# Altium footprint library HW_HOLLAND_NCDM_MONITOR_R1.PcbLib: 472 footprints (part 21 of 30)
Each footprint in its own frame and in the unit in brackets; x right, y up, seen from the top. Pads: shape width x height; smd on the part's side, far side on the other; paste and mask are expansions set on the pad; w line width, h text height; cw(c..) or ccw(c..) is an arc to the next point about the centre after c.
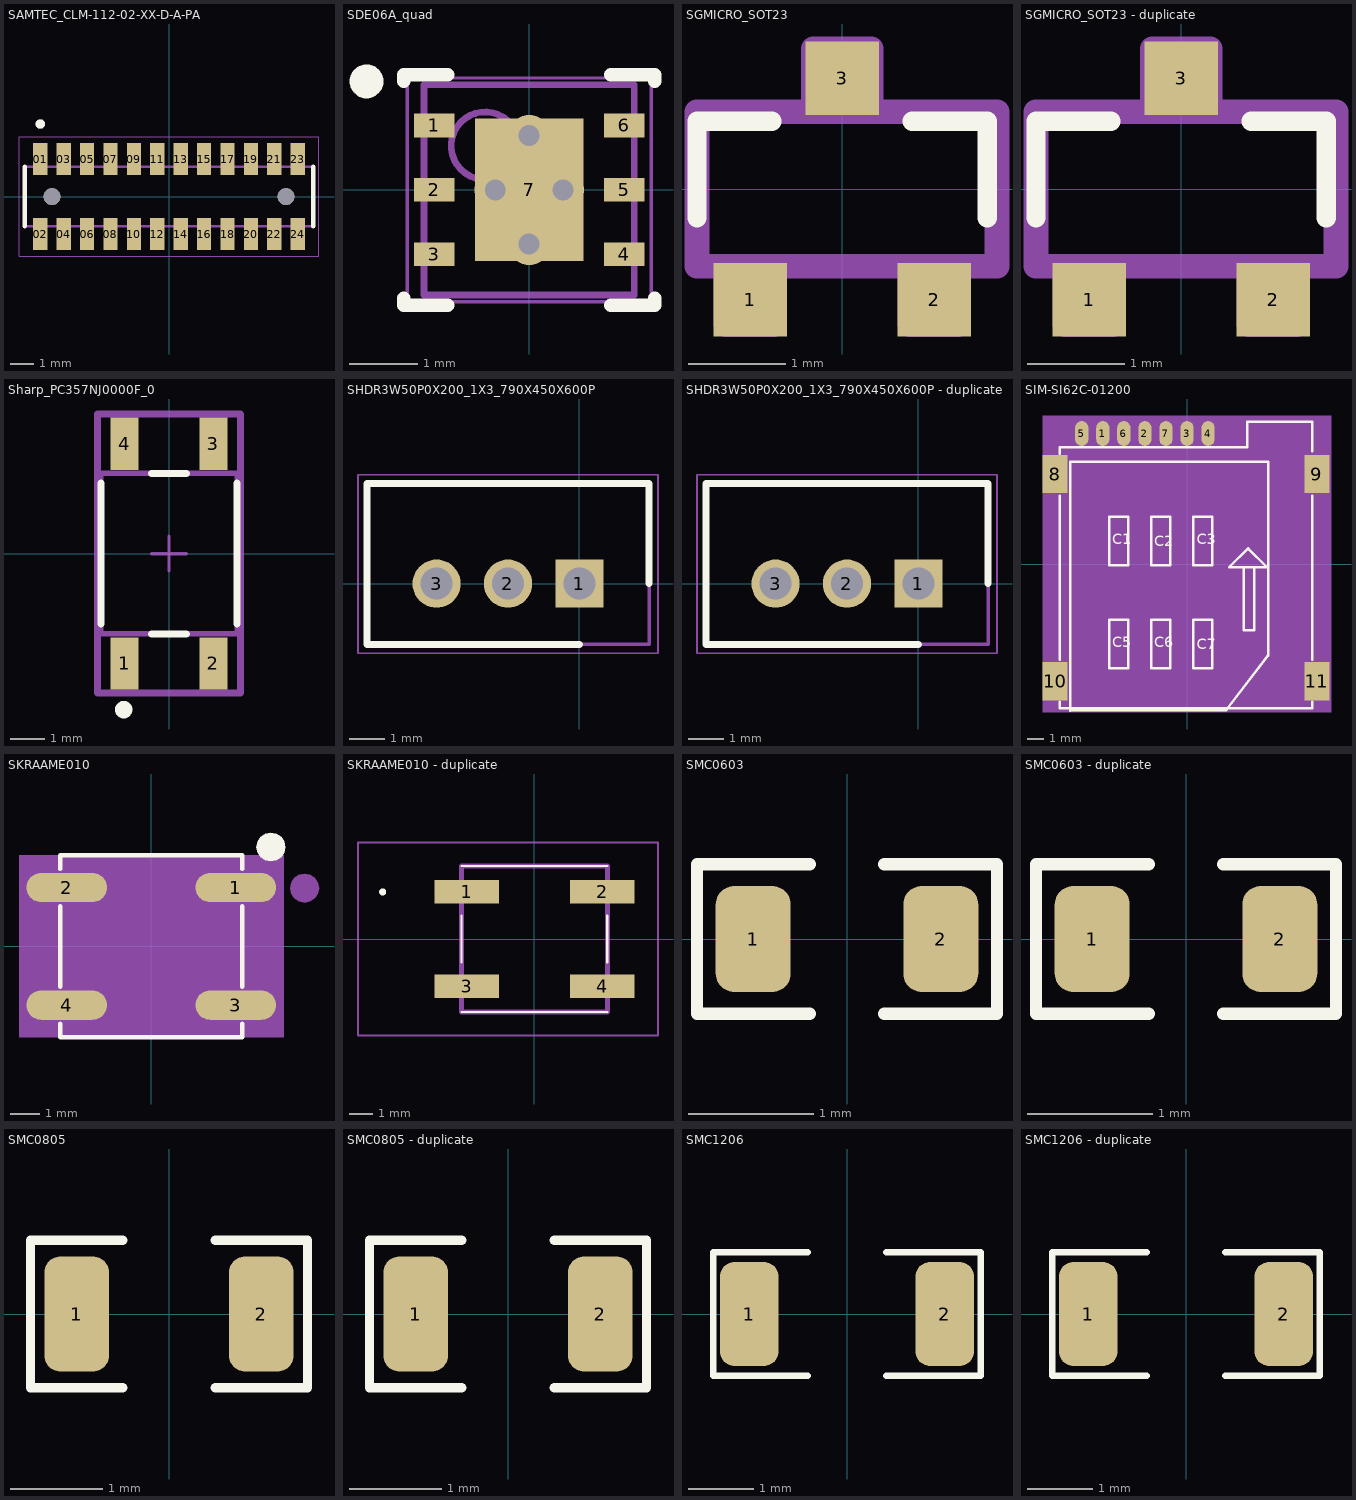
[diagram p20: the footprints below, top view; thin cyan lines are the x and y axes]

## SAMTEC_CLM-112-02-XX-D-A-PA [mm]
pads (26):
  rect 0.61x1.37 smd: 01(-5.5,1.601) 02(-5.5,-1.601) 03(-4.5,1.601) 04(-4.5,-1.601) 05(-3.5,1.601) 06(-3.5,-1.601) 07(-2.5,1.601) 08(-2.5,-1.601) 09(-1.5,1.601) 10(-1.5,-1.601) 11(-0.5,1.601) 12(-0.5,-1.601) 13(0.5,1.601) 14(0.5,-1.601) 15(1.5,1.601) 16(1.5,-1.601) 17(2.5,1.601) 18(2.5,-1.601) 19(3.5,1.601) 20(3.5,-1.601) 21(4.5,1.601) 22(4.5,-1.601) 23(5.5,1.601) 24(5.5,-1.601)
  round 0.715 hole 0.715 unplated: ""(-5,0) ""(5,0)
Top Overlay:
  circle w0.2: c-5.5,3.1 r0.1
  lines w0.2: -6.159,-1.27 -6.159,1.27 ; 6.159,-1.27 6.159,1.27
Mechanical 13:
  circle w0.2: c-5.5,3.1 r0.1
  lines w0.1: -6.159,-1.27 -6.159,1.27 6.159,1.27 6.159,-1.27 -6.159,-1.27
Mechanical 15:
  lines w0.05: -6.409,-2.55 -2.04,-2.55 2.04,-2.55 6.409,-2.55 6.409,2.55 2.04,2.55 -2.04,2.55 -6.409,2.55 -6.409,-2.55
3D body "CLM-112-02-G-D-A-TR.stp": height 2.27, standoff -0.48, extent -6.159,-1.905 6.159,1.905

## SDE06A_quad [mm]
pads (7):
  rect 0.6x0.35 smd paste-0.175 mask+0.051: 1(-1.4,0.95) 2(-1.4,0) 3(-1.4,-0.95) 4(1.4,-0.95) 5(1.4,0) 6(1.4,0.95)
  rect 1.6x2.1 smd paste-0.8 mask+0.051: 7(0,0)
via -0.5,0 diameter 0.61 hole 0.308
via 0,0.8 diameter 0.61 hole 0.308
via 0.5,0 diameter 0.61 hole 0.308
via 0,-0.8 diameter 0.61 hole 0.308
Top Overlay:
  circle w0.25: c-2.4,1.6 r0.125
  lines w0.2: -1.85,-1.6 -1.85,-1.7 -1.2,-1.7 ; -1.85,1.6 -1.85,1.7 -1.2,1.7 ; 1.2,-1.7 1.85,-1.7 1.85,-1.6 ; 1.2,1.7 1.85,1.7 1.85,1.6
Top Paste:
  rectangle: -1.9,0.775 -1.2,1.125
  rectangle: -1.9,-0.175 -1.2,0.175
  rectangle: -1.9,-1.125 -1.2,-0.775
  region: 1.9,-0.775 1.2,-0.775 1.2,-1.125 1.9,-1.125
  region: 1.9,0.175 1.2,0.175 1.2,-0.175 1.9,-0.175
  region: 1.9,1.125 1.2,1.125 1.2,0.775 1.9,0.775
  rectangle: 0.1,0.1 0.7,0.95
  region: -0.1,0.95 -0.7,0.95 -0.7,0.1 -0.1,0.1
  region: -0.1,-0.1 -0.7,-0.1 -0.7,-0.95 -0.1,-0.95
  rectangle: 0.1,-0.95 0.7,-0.1
Mechanical 13:
  circle w0.1: c-0.65,0.65 r0.5
  lines w0.1: -1.55,-1.55 -1.55,1.55 1.55,1.55 1.55,-1.55 -1.55,-1.55
Mechanical 15:
  lines w0.05: -1.8,-1.65 1.8,-1.65 1.8,1.65 -1.8,1.65 -1.8,-1.65
  lines w0.1: -0.5,0 0.5,0 ; 0,-0.5 0,0.5
3D body: height 0.8, standoff 0, extent -1.55,-1.55 1.55,1.55

## SGMICRO_SOT23 [mm]
pads (3):
  rect 0.76x0.76 smd: 1(-0.95,-1.145) 2(0.95,-1.145) 3(0,1.145)
Top Overlay:
  lines w0.2: -1.5,-0.3 -1.5,0.7 -0.725,0.7 ; 0.725,0.7 1.5,0.7 1.5,-0.3
Top Designator:
  lines w0.254: -1.2,-0.8 -1.2,-1.4 -0.7,-1.4 -0.7,-0.8 ; -0.3,0.8 -0.3,1.45 0.3,1.45 0.3,0.8 ; 0.7,-0.8 0.7,-1.4 1.2,-1.4 1.2,-0.8 ; -1.5,-0.8 -1.5,0.8 1.6,0.8 1.6,-0.8 -1.5,-0.8
  text ".Designator" at -3.809,-0.254 h0.76
3D body "SOT23_FMMT493TA.step": height 1.1, standoff 0, extent -1.5,-1.25 1.5,1.25

## SGMICRO_SOT23 - duplicate [mm]
pads (3):
  rect 0.76x0.76 smd: 1(-0.95,-1.145) 2(0.95,-1.145) 3(0,1.145)
Top Overlay:
  lines w0.2: -1.5,-0.3 -1.5,0.7 -0.725,0.7 ; 0.725,0.7 1.5,0.7 1.5,-0.3
Top Designator:
  lines w0.254: -1.2,-0.8 -1.2,-1.4 -0.7,-1.4 -0.7,-0.8 ; -0.3,0.8 -0.3,1.45 0.3,1.45 0.3,0.8 ; 0.7,-0.8 0.7,-1.4 1.2,-1.4 1.2,-0.8 ; -1.5,-0.8 1.6,-0.8 1.6,0.8 -1.5,0.8 -1.5,-0.8
  text ".Designator" at -3.809,-0.254 h0.76
3D body "SOT23_FMMT493TA.step": height 1.1, standoff 0, extent -1.5,-1.25 1.5,1.25

## Sharp_PC357NJ0000F_0 [mm]
pads (4):
  rect 0.8x1.5 smd paste+0 mask+0: 1(-1.27,-3.15) 2(1.27,-3.15) 3(1.27,3.15) 4(-1.27,3.15)
Top Overlay:
  circle w0.25: c-1.3,-4.475 r0.125
  lines w0.2: -1.95,-2.025 -1.95,2.025 ; -0.495,-2.3 0.495,-2.3 ; -0.495,2.3 0.495,2.3 ; 1.95,-2.025 1.95,2.025
Top Courtyard:
  lines w0.2: -2.05,-4 -2.05,4 2.05,4 2.05,-4 -2.05,-4
  text ".Designator" at 0,0 h1.25
Mechanical 12:
  lines w0.15: -1.95,-2.3 -1.95,2.3 1.95,2.3 1.95,-2.3 -1.95,-2.3
Mechanical 15:
  lines w0.1: -0.5,0 0.5,0 ; 0,-0.5 0,0.5
  lines w0.2: -2.05,-4 -2.05,4 2.05,4 2.05,-4 -2.05,-4
3D body "IC_Sharp_PC357NJ0000F_eec.STEP": height 0.25, standoff 0, extent -2.05,-4 2.05,4

## SHDR3W50P0X200_1X3_790X450X600P [mm]
pads (3):
  rect 1.35x1.35 hole 0.9: 1(0,0)
  round 1.35 hole 0.9: 2(-2,0) 3(-4,0)
Top Overlay:
  lines w0.2: 0,-1.7 -5.95,-1.7 -5.95,2.8 1.95,2.8 1.95,0
Mechanical 13:
  lines w0.1: -5.95,-1.7 1.95,-1.7 1.95,2.8 -5.95,2.8 -5.95,-1.7
Mechanical 15:
  lines w0.05: -6.2,-1.95 2.2,-1.95 2.2,3.05 -6.2,3.05 -6.2,-1.95
3D body "JST - PH - Thru (V) - 3Pin - 2.00mm.stp": height 5.89, standoff -3.05, extent -5.861,-1.737 2,2.937

## SHDR3W50P0X200_1X3_790X450X600P - duplicate [mm]
pads (3):
  rect 1.35x1.35 hole 0.9: 1(0,0)
  round 1.35 hole 0.9: 2(-2,0) 3(-4,0)
Top Overlay:
  lines w0.2: 0,-1.7 -5.95,-1.7 -5.95,2.8 1.95,2.8 1.95,0
Mechanical 13:
  lines w0.1: -5.95,-1.7 1.95,-1.7 1.95,2.8 -5.95,2.8 -5.95,-1.7
Mechanical 15:
  lines w0.05: -6.2,-1.95 2.2,-1.95 2.2,3.05 -6.2,3.05 -6.2,-1.95
3D body "JST - PH - Thru (V) - 3Pin - 2.00mm.stp": height 5.89, standoff -3.05, extent -5.861,-1.737 2,2.937

## SIM-SI62C-01200 [mil]
pads (11):
  oval 31.5x59.06 smd: 1(-200.06,309.9) 2(-100.06,309.9) 3(-0.06,309.9) 4(49.94,309.9) 5(-250.06,309.9) 6(-150.06,309.9) 7(-50.06,309.9)
  rect 59.06x90.55 smd: 8(-313.52,213.56) 9(308.52,213.56) 10(-313.52,-278.56) 11(308.52,-278.56)
Top Overlay:
  lines w6: -302.5,-327.5 -302.5,-342.5 297.5,-342.5 297.5,-327.5 ; -302.5,-227.5 -302.5,162.5 ; -302.5,262.5 -302.5,277.5 142.5,277.5 142.5,337.5 297.5,337.5 297.5,267.5 ; 297.5,-227.5 297.5,162.5 ; -277.5,-348.05 92.5,-347.5 192.5,-217.5 192.5,242.5 -277.5,242.5 -277.5,-348.05 ; -184.98,-247.78 -184.98,-132.78 -139.98,-132.78 -139.98,-247.78 -184.98,-247.78 ; -184.98,-2.78 -184.98,112.22 -139.98,112.22 -139.98,-2.78 -184.98,-2.78 ; -84.98,-247.78 -84.98,-132.78 -39.98,-132.78 -39.98,-247.78 -84.98,-247.78 ; -84.98,-2.78 -84.98,112.22 -39.98,112.22 -39.98,-2.78 -84.98,-2.78 ; 15.02,-247.78 15.02,-132.78 60.02,-132.78 60.02,-247.78 15.02,-247.78 ; 15.02,-2.78 15.02,112.22 60.02,112.22 60.02,-2.78 15.02,-2.78 ; 100.02,-7.78 145.02,37.22 190.02,-7.78 100.02,-7.78 ; 135.02,-157.78 135.02,-7.78 160.02,-7.78 160.02,-157.78 135.02,-157.78
  text "C1" at -177.5,47.5 h25
  text "C2" at -77.5,42.5 h25
  text "C3" at 22.5,47.5 h25
  text "C5" at -177.5,-197.5 h25
  text "C6" at -77.5,-197.5 h25
  text "C7" at 22.5,-202.5 h25
Top Assembly:
  lines w1: -303.68,-341.56 298.68,-341.56 298.68,335.61 141.2,335.61 141.2,276.56 -303.68,276.56 -303.68,-341.56
Top 3D Body:
  region: -342.5,352.5 342.5,352.5 342.5,-352.5 -342.5,-352.5
Mechanical 17:
  text "6" at -157.26,309.9 h18
  text "1" at -207.26,309.9 h18
  text "7" at -57.26,309.9 h18
  text "4" at 42.74,309.9 h18
  text "2" at -107.26,309.9 h18
  text "3" at -7.26,309.9 h18
  text "10" at -327.92,-278.56 h18
  text "11" at 294.12,-278.56 h18
  text "8" at -320.72,213.56 h18
  text "5" at -257.26,309.9 h18
  text "9" at 301.32,213.56 h18
3D body: height 150, standoff 0, extent -342.5,-352.5 342.5,352.5

## SKRAAME010 [mm]
pads (4):
  oval 2.75x1 smd: 1(2.875,2) 2(-2.875,2) 3(2.875,-2) 4(-2.875,-2)
Top Overlay:
  dashed: 4.564,3.379 4.527,3.567 4.42,3.727 4.26,3.834 4.071,3.872 3.882,3.834 3.829,3.798 3.722,3.727 3.615,3.567 3.578,3.379 3.615,3.19 3.722,3.03 3.829,2.959 3.882,2.923 4.071,2.885 4.26,2.923 4.42,3.03 4.527,3.19
  lines w0.152: -3.1,-2.63 -3.1,-3.1 3.1,-3.1 3.1,-2.63 ; -3.1,-1.37 -3.1,1.37 ; -3.1,2.63 -3.1,3.1 3.1,3.1 3.1,2.63 ; 3.1,-1.37 3.1,1.37
  text ".Designator" at -0.635,-0.212 h0.64
Top Assembly:
  dashed: 5.707,1.982 5.67,2.17 5.563,2.33 5.403,2.437 5.214,2.475 5.025,2.437 4.972,2.401 4.865,2.33 4.758,2.17 4.721,1.982 4.758,1.793 4.865,1.633 4.972,1.562 5.025,1.526 5.214,1.488 5.403,1.526 5.563,1.633 5.67,1.793
  lines w0.025: -3.1,-3.1 -3.1,3.1 3.1,3.1 3.1,-3.1 -3.1,-3.1
Top 3D Body:
  region: -4.5,3.1 -4.5,-3.1 4.5,-3.1 4.5,3.1
Mechanical 17:
  text "4" at -3.066,-2.37 h0.46
  text "3" at 2.664,-2.37 h0.46
  text "2" at -3.036,1.67 h0.46
  text "1" at 2.764,1.73 h0.46
3D body: height 3.81, standoff 0, extent -4.5,-3.1 4.5,3.1

## SKRAAME010 - duplicate [mm]
pads (4):
  rect 2.75x1 smd: 1(-2.875,2) 2(2.875,2) 3(-2.875,-2) 4(2.875,-2)
Top Overlay:
  lines w0.1: -3.1,-3.1 3.1,-3.1 -3.1,-3.1 ; -3.1,-1 -3.1,1 -3.1,-1 ; -3.1,3.1 3.1,3.1 -3.1,3.1 ; 3.1,-1 3.1,1 3.1,-1
  lines w0.2: -6.5,2 ccw(c-6.45,2) -6.4,2 ; -6.5,2 cw(c-6.45,2) -6.4,2 ; -6.5,2 ccw(c-6.45,2) -6.4,2
Mechanical 13:
  lines w0.2: -3.1,-3.1 -3.1,3.1 3.1,3.1 3.1,-3.1 -3.1,-3.1
Mechanical 15:
  lines w0.1: -7.5,-4.1 -7.5,4.1 5.25,4.1 5.25,-4.1 -7.5,-4.1
3D body "SKRAAME010.stp": height 5.1, standoff -0.08, extent -3.399,-3.215 3.399,3.215

## SMC0603 [mm]
pads (2):
  rrect50% 0.6x0.85 smd: 1(-0.75,0) 2(0.75,0)
Top Overlay:
  lines w0.1: -0.3,-0.6 -1.2,-0.6 -1.2,0.6 -0.3,0.6 ; 0.3,-0.6 1.2,-0.6 1.2,0.6 0.3,0.6
3D body "Cap 0603(1608)x80N.STEP": height 0.81, standoff 0, extent -0.8,-0.4 0.8,0.4

## SMC0603 - duplicate [mm]
pads (2):
  rrect50% 0.6x0.85 smd: 1(-0.75,0) 2(0.75,0)
Top Overlay:
  lines w0.1: -0.3,-0.6 -1.2,-0.6 -1.2,0.6 -0.3,0.6 ; 0.3,-0.6 1.2,-0.6 1.2,0.6 0.3,0.6
3D body "Cap 0603(1608)x80N.STEP": height 0.81, standoff 0, extent -0.8,-0.4 0.8,0.4

## SMC0805 [mm]
pads (2):
  rrect50% 0.7x1.25 smd: 1(-1,0) 2(1,0)
Top Overlay:
  lines w0.1: -0.5,-0.8 -1.5,-0.8 -1.5,0.8 -0.5,0.8 ; 0.5,-0.8 1.5,-0.8 1.5,0.8 0.5,0.8
3D body "Cap 0805(2012)x85N.STEP": height 0.86, standoff 0, extent -1,-0.625 1,0.625

## SMC0805 - duplicate [mm]
pads (2):
  rrect50% 0.7x1.25 smd: 1(-1,0) 2(1,0)
Top Overlay:
  lines w0.1: -0.5,-0.8 -1.5,-0.8 -1.5,0.8 -0.5,0.8 ; 0.5,-0.8 1.5,-0.8 1.5,0.8 0.5,0.8
3D body "Cap 0805(2012)x85N.STEP": height 0.86, standoff 0, extent -1,-0.625 1,0.625

## SMC1206 [mm]
pads (2):
  rrect50% 0.9x1.6 smd mask+0.102: 1(-1.5,0) 2(1.5,0)
Top Overlay:
  lines w0.1: -0.6,-0.95 -2.05,-0.95 -2.05,0.95 -0.6,0.95 ; 0.6,-0.95 2.05,-0.95 2.05,0.95 0.6,0.95
3D body "Cap 1206(3216)x125N.STEP": height 1.26, standoff 0, extent -1.6,-0.8 1.6,0.8

## SMC1206 - duplicate [mm]
pads (2):
  rrect50% 0.9x1.6 smd mask+0.102: 1(-1.5,0) 2(1.5,0)
Top Overlay:
  lines w0.1: -0.6,-0.95 -2.05,-0.95 -2.05,0.95 -0.6,0.95 ; 0.6,-0.95 2.05,-0.95 2.05,0.95 0.6,0.95
3D body "Cap 1206(3216)x125N.STEP": height 1.26, standoff 0, extent -1.6,-0.8 1.6,0.8